# Altium footprint library YS_PCBLIB.PcbLib: 133 footprints (part 4 of 9)
Each footprint in its own frame and in the unit in brackets; x right, y up, seen from the top. Pads: shape width x height; smd on the part's side, far side on the other; paste and mask are expansions set on the pad; w line width, h text height; cw(c..) or ccw(c..) is an arc to the next point about the centre after c.
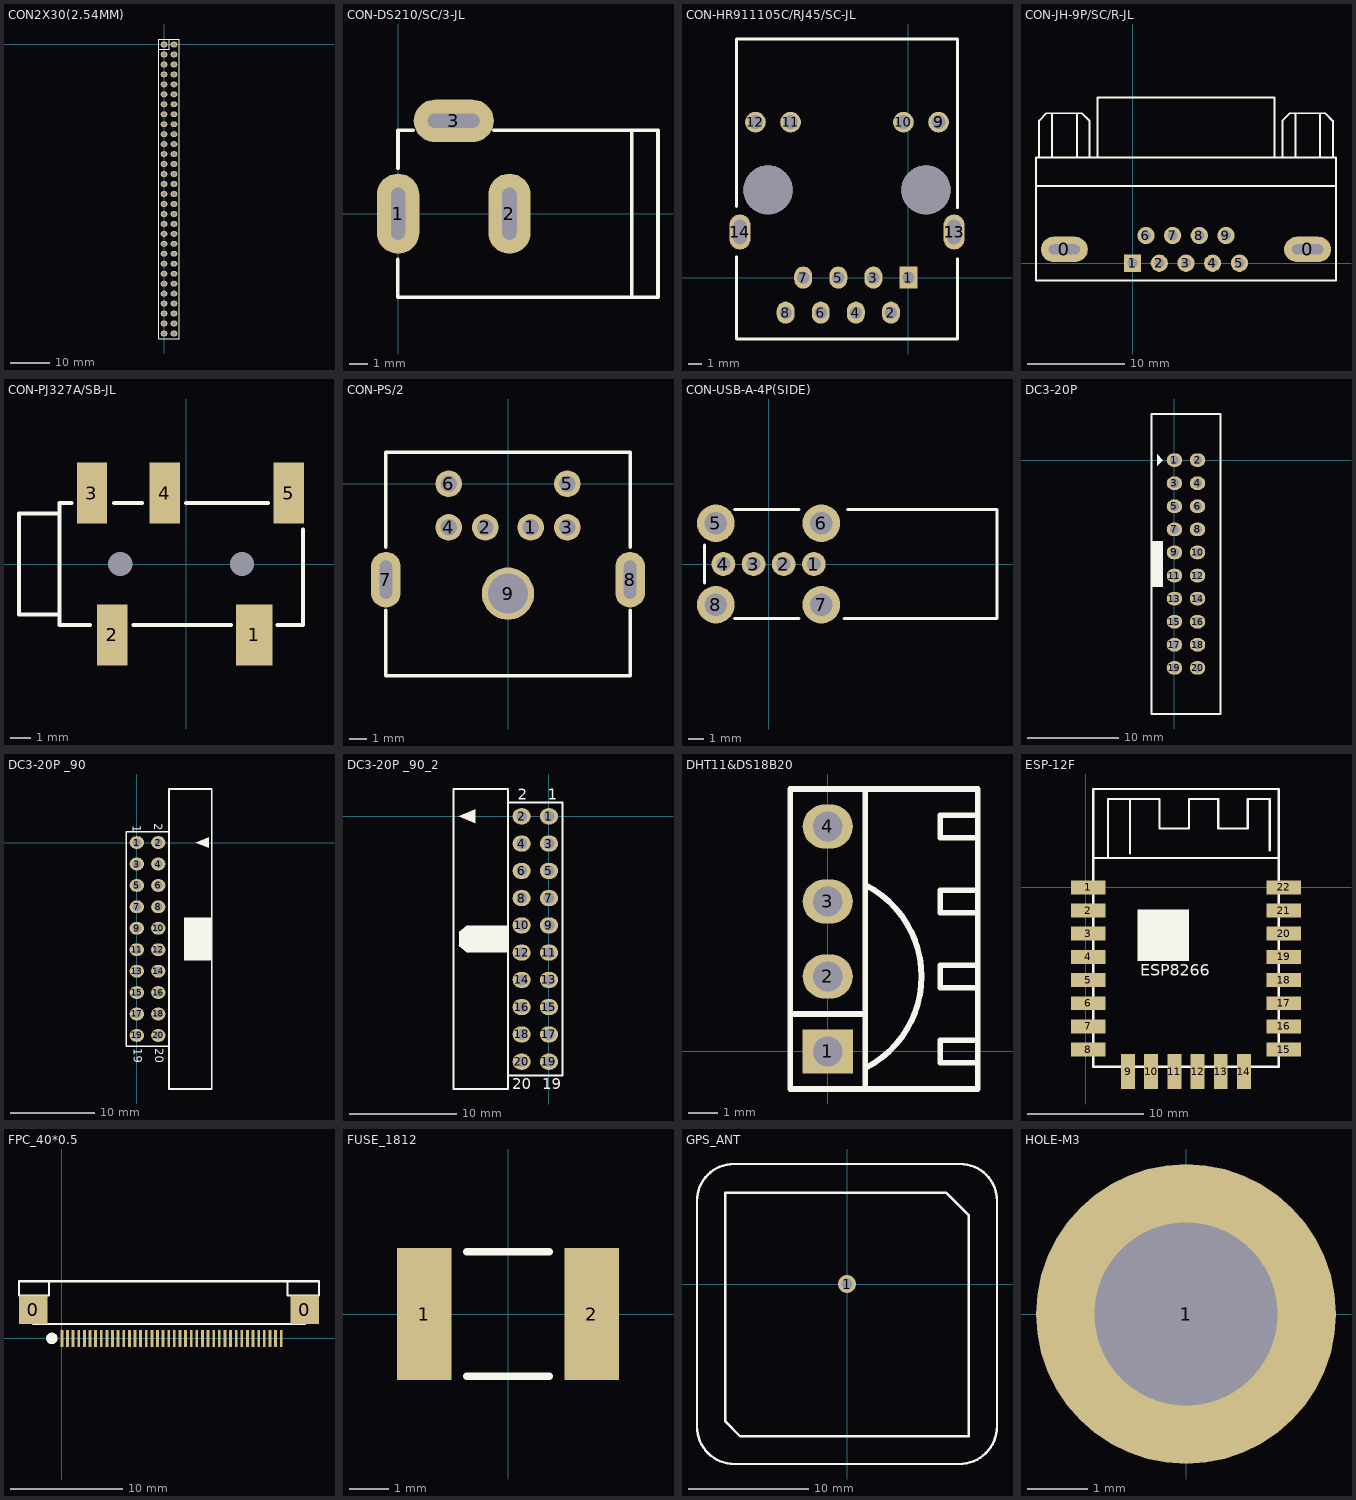
[diagram p3: the footprints below, top view; thin cyan lines are the x and y axes]

## CON2X30(2.54MM) [mm]
pads (60):
  oval 1.7x1.5 hole 1: 1(0,0) 2(2.54,0) 3(0,-2.54) 4(2.54,-2.54) 5(0,-5.08) 6(2.54,-5.08) 7(0,-7.62) 8(2.54,-7.62) 9(0,-10.16) 10(2.54,-10.16) 11(0,-12.7) 12(2.54,-12.7) 13(0,-15.24) 14(2.54,-15.24) 15(0,-17.78) 16(2.54,-17.78) 17(0,-20.32) 18(2.54,-20.32) 19(0,-22.86) 20(2.54,-22.86) 21(0,-25.4) 22(2.54,-25.4) 23(0,-27.94) 24(2.54,-27.94) 25(0,-30.48) 26(2.54,-30.48) 27(0,-33.02) 28(2.54,-33.02) 29(0,-35.56) 30(2.54,-35.56) 31(0,-38.1) 32(2.54,-38.1) 33(0,-40.64) 34(2.54,-40.64) 35(0,-43.18) 36(2.54,-43.18) 37(0,-45.72) 38(2.54,-45.72) 39(0,-48.26) 40(2.54,-48.26) 41(0,-50.8) 42(2.54,-50.8) 43(0,-53.34) 44(2.54,-53.34) 45(0,-55.88) 46(2.54,-55.88) 47(0,-58.42) 48(2.54,-58.42) 49(0,-60.96) 50(2.54,-60.96) 51(0,-63.5) 52(2.54,-63.5) 53(0,-66.04) 54(2.54,-66.04) 55(0,-68.58) 56(2.54,-68.58) 57(0,-71.12) 58(2.54,-71.12) 59(0,-73.66) 60(2.54,-73.66)
Top Overlay:
  lines w0.2: -1.397,-1.27 1.27,-1.27 1.27,1.397 ; -1.397,-75.057 -1.397,1.397 3.937,1.397 3.937,-75.057 -1.397,-75.057

## CON-DS210/SC/3-JL [mil]
pads (3):
  oval 90x170 hole 30 slot 110 at 90 deg: 1(0,0) 2(236.22,0)
  oval 170x90 hole 30 slot 110 at 0 deg: 3(118.11,196.85)
Top Overlay:
  lines w7.87: -0.89,-96.46 -0.89,-177.16 551.18,-177.16 551.18,177.16 202.76,177.16 ; -0.04,96.46 -0.04,176.78 31.5,176.78 ; 495.63,-171.73 495.63,176.27

## CON-HR911105C/RJ45/SC-JL [mm]
pads (16):
  rect 1.3x1.6 hole 0.9: 1(0,0)
  oval 1.3x1.6 hole 0.9: 2(-1.27,-2.54) 3(-2.54,0) 4(-3.81,-2.54) 5(-5.08,0) 6(-6.35,-2.54) 7(-7.62,0) 8(-8.89,-2.54)
  round 1.5 hole 1.02: 9(2.175,11.25) 10(-0.365,11.25) 11(-8.535,11.25) 12(-11.075,11.25)
  oval 1.524x2.54 hole 1.016 slot 1.778 at 90 deg: 13(3.3,3.3) 14(-12.2,3.3)
  round 3.556 hole 3.556: ""(-10.165,6.35) ""(1.265,6.35)
Top Overlay:
  lines w0.2: -12.45,1.503 -12.45,-4.445 3.55,-4.445 3.55,1.372 ; -12.45,5.147 -12.45,17.27 3.55,17.27 3.55,5.053

## CON-JH-9P/SC/R-JL [mil]
pads (11):
  oval 190x102.36 hole 39.37 slot 125.98 at 0 deg: 0(-275.79,55.91) 0(708.07,55.91)
  rect 70x70 hole 40: 1(0,0)
  round 70 hole 40: 2(108.27,0) 3(216.14,0) 4(324.02,0) 5(432.28,0) 6(54.33,111.81) 7(162.2,111.81) 8(270.08,111.81) 9(377.95,111.81)
Top Overlay:
  lines w7.87: -390.35,312.84 822.8,312.84 ; -378.15,426.77 -378.15,576.85 ; -378.15,575 -378.15,576.85 ; -325,426.77 -325,605 ; -225,426.77 -225,606.3 ; -173.43,426.77 -173.43,575 -204.73,606.3 -348.7,606.3 -378.15,576.85 ; 605.71,426.77 605.71,576.85 ; 605.71,575 605.71,576.85 ; 658.86,426.77 658.86,605 ; 758.86,426.77 758.86,606.3 ; 810.43,426.77 810.43,575 779.13,606.3 635.16,606.3 605.71,576.85 ; 822.64,426.77 822.64,-70.08 -390.35,-70.08 -390.35,426.77 822.8,426.77 ; -142.13,426.77 574.41,426.77 574.41,670.08 -142.13,670.08 -142.13,426.77

## CON-PJ327A/SB-JL [mm]
pads (7):
  rect 1.8x3 smd: 1(3.35,-3.5)
  rect 1.5x3 smd: 2(-3.65,-3.5) 3(-4.65,3.5) 4(-1.05,3.5) 5(5.05,3.5)
  round 1.15 hole 1.2 unplated: ""(-3.25,0) ""(2.75,0)
Top Overlay:
  lines w0.2: -6.295,-2.5 -8.25,-2.5 -8.25,2.5 -6.25,2.5 ; -6.25,-3 -6.25,3 -5.67,3 ; -6.2,-3 -4.75,-3 ; -3.55,3 -2.18,3 ; -2.6,-3 2.2,-3 ; 0,3 4.04,3 ; 4.5,-3 5.75,-3 5.75,1.7

## CON-PS/2 [mil]
pads (9):
  round 60 hole 37: 1(51.18,-98.43) 2(-51.18,-98.43) 3(133.86,-98.43) 4(-133.86,-98.43) 5(133.86,0) 6(-133.86,0)
  oval 66.93x125.98 hole 27.56 slot 86.61 at 90 deg: 7(-275.59,-216.54) 8(275.59,-216.54)
  round 118 hole 90: 9(0,-248.03)
Top Overlay:
  lines w7.87: -275.59,-285.11 -275.59,-433.07 275.59,-433.07 275.59,-285.11 ; -275.59,-143.69 -275.59,70.87 275.59,70.87 275.59,-143.69

## CON-USB-A-4P(SIDE) [mm]
pads (8):
  round 1.575 hole 0.92: 1(3,0) 2(1,0) 3(-1,0) 4(-3,0)
  round 2.5 hole 1.5: 5(-3.5,2.7) 6(3.5,2.7) 7(3.5,-2.7) 8(-3.5,-2.7)
Top Overlay:
  lines w0.2: -4.25,-1.25 -4.25,1.25 ; -2.25,-3.6 2,-3.6 ; -2.25,3.6 2,3.6 ; 5,-3.6 15.15,-3.6 15.15,3.6 5.25,3.6

## DC3-20P [mm]
pads (20):
  oval 1.7x1.5 hole 1: 1(0,0) 2(2.54,0) 3(0,-2.54) 4(2.54,-2.54) 5(0,-5.08) 6(2.54,-5.08) 7(0,-7.62) 8(2.54,-7.62) 9(0,-10.16) 10(2.54,-10.16) 11(0,-12.7) 12(2.54,-12.7) 13(0,-15.24) 14(2.54,-15.24) 15(0,-17.78) 16(2.54,-17.78) 17(0,-20.32) 18(2.54,-20.32) 19(0,-22.86) 20(2.54,-22.86)
Top Overlay:
  rectangle: -2.54,-13.97 -1.27,-8.89
  region: -1.905,0.635 -1.27,0 -1.905,-0.635
  lines w0.2: -2.54,-27.94 -2.54,0 -2.54,2.54 -2.54,5.08 5.08,5.08 5.08,-27.94 -2.54,-27.94

## DC3-20P _90 [mm]
pads (20):
  oval 1.7x1.5 hole 1: 1(0,0) 2(2.54,0) 3(0,-2.54) 4(2.54,-2.54) 5(0,-5.08) 6(2.54,-5.08) 7(0,-7.62) 8(2.54,-7.62) 9(0,-10.16) 10(2.54,-10.16) 11(0,-12.7) 12(2.54,-12.7) 13(0,-15.24) 14(2.54,-15.24) 15(0,-17.78) 16(2.54,-17.78) 17(0,-20.32) 18(2.54,-20.32) 19(0,-22.86) 20(2.54,-22.86)
Top Overlay:
  rectangle: 5.588,-13.97 8.89,-8.89
  region: 8.509,-0.635 8.509,0 6.985,0
  region: 8.509,0.635 8.509,0 6.985,0
  lines w0.203: 3.81,-24.13 3.81,-29.21 8.89,-29.21 8.89,6.35 3.81,6.35 3.81,1.27 ; 3.81,-24.13 3.81,1.27 ; 3.81,-24.13 -1.27,-24.13 -1.27,1.27 3.81,1.27
  text "1" at -0.508,2.032 h1.02
  text "2" at 2.032,2.286 h1.02
  text "19" at -0.381,-24.384 h1.02
  text "20" at 2.159,-24.384 h1.02

## DC3-20P _90_2 [mm]
pads (20):
  oval 1.7x1.5 hole 1: 1(0,0) 2(-2.54,0) 3(0,-2.54) 4(-2.54,-2.54) 5(0,-5.08) 6(-2.54,-5.08) 7(0,-7.62) 8(-2.54,-7.62) 9(0,-10.16) 10(-2.54,-10.16) 11(0,-12.7) 12(-2.54,-12.7) 13(0,-15.24) 14(-2.54,-15.24) 15(0,-17.78) 16(-2.54,-17.78) 17(0,-20.32) 18(-2.54,-20.32) 19(0,-22.86) 20(-2.54,-22.86)
Top Overlay:
  region: -7.62,-10.795 -8.382,-10.795 -8.382,-12.065 -7.62,-12.065
  region: -3.81,-10.16 -7.62,-10.16 -7.62,-12.7 -3.81,-12.7
  region: -7.62,-12.7 -7.62,-12.065 -8.382,-12.065
  region: -7.62,-10.16 -7.62,-10.795 -8.382,-10.795
  region: -6.858,0.635 -6.858,0 -8.382,0
  region: -6.858,-0.635 -6.858,0 -8.382,0
  lines w0.203: -3.81,-24.13 1.27,-24.13 1.27,1.27 -3.81,1.27 ; -3.81,-24.13 -3.81,1.27 ; -3.81,-24.13 -3.81,-25.4 -8.89,-25.4 -8.89,2.54 -3.81,2.54 -3.81,1.27
  text "20" at -3.429,-25.4 h1.02
  text "19" at -0.635,-25.4 h1.02
  text "2" at -2.921,1.524 h1.02
  text "1" at -0.127,1.524 h1.02

## DHT11&DS18B20 [mm]
pads (4):
  rect 1.7x1.5 hole 1: 1(0,0)
  oval 1.7x1.5 hole 1: 2(0,2.54) 3(0,5.08) 4(0,7.62)
Top Overlay:
  lines w0.2: -1.27,1.27 1.27,1.27 ; 1.301,-0.545 ccw(c-0.302,2.54) 1.301,5.625 ; 5.08,-0.381 3.81,-0.381 3.81,0.381 5.08,0.381 ; 5.08,2.159 3.81,2.159 3.81,2.921 5.08,2.921 ; 5.08,4.699 3.81,4.699 3.81,5.461 5.08,5.461 ; 5.08,7.239 3.81,7.239 3.81,8.001 5.08,8.001 ; 1.27,-1.27 -1.27,-1.27 -1.27,8.89 1.27,8.89 ; 1.27,-1.27 1.27,8.89 ; 1.27,-1.27 5.08,-1.27 5.08,8.89 1.27,8.89

## ESP-12F [mm]
pads (22):
  rect 3x1.2 smd: 1(0.203,0) 2(0.203,-2) 3(0.203,-4) 4(0.203,-6) 5(0.203,-8) 6(0.203,-10) 7(0.203,-12) 8(0.203,-14) 15(17.069,-14) 16(17.069,-12) 17(17.069,-10) 18(17.069,-8) 19(17.069,-6) 20(17.069,-4) 21(17.069,-2) 22(17.069,0)
  rect 1.2x3 smd: 9(3.632,-15.9) 10(5.632,-15.9) 11(7.632,-15.9) 12(9.632,-15.9) 13(11.632,-15.9) 14(13.632,-15.9)
Top Overlay:
  rectangle: 4.445,-6.35 8.89,-1.905
  lines w0.2: 0.635,2.54 16.637,2.54 ; 1.905,2.54 1.905,7.62 6.35,7.62 6.35,5.08 8.89,5.08 8.89,7.62 11.43,7.62 11.43,5.08 13.97,5.08 13.97,7.62 15.875,7.62 15.875,3.175 ; 3.81,2.921 3.81,7.62 ; 0.635,-15.494 16.637,-15.494 16.637,8.486 0.635,8.486 0.635,-15.494
  text "ESP8266" at 4.699,-7.62 h1

## FPC_40*0.5 [mm]
pads (42):
  rect 2.54x2.54 smd: 0(-2.54,2.54) 0(21.59,2.54)
  rect 0.25x1.5 smd: 1(0,0) 2(0.5,0) 3(1,0) 4(1.5,0) 5(2,0) 6(2.5,0) 7(3,0) 8(3.5,0) 9(4,0) 10(4.5,0) 11(5,0) 12(5.5,0) 13(6,0) 14(6.5,0) 15(7,0) 16(7.5,0) 17(8,0) 18(8.5,0) 19(9,0) 20(9.5,0) 21(10,0) 22(10.5,0) 23(11,0) 24(11.5,0) 25(12,0) 26(12.5,0) 27(13,0) 28(13.5,0) 29(14,0) 30(14.5,0) 31(15,0) 32(15.5,0) 33(16,0) 34(16.5,0) 35(17,0) 36(17.5,0) 37(18,0) 38(18.5,0) 39(19,0) 40(19.5,0)
Top Overlay:
  circle w0.508: c-0.889,0 r0.254
  lines w0.2: -2.159,3.81 -3.81,3.81 -3.81,5.08 -1.143,5.08 ; 21.336,3.81 22.86,3.81 22.86,5.08 20.066,5.08 ; -1.143,5.08 20.066,5.08 ; -1.143,5.08 -1.143,3.81 -2.54,3.81 -2.54,1.27 -0.635,1.27 21.59,1.27 21.59,3.81 20.066,3.81 20.066,5.08

## FUSE_1812 [mm]
height 0.34
pads (2):
  rect 1.4x3.4 smd: 1(-2.15,0) 2(2.15,0)
Top Overlay:
  lines w0.2: -1.05,-1.6 1.05,-1.6 ; -1.05,1.6 1.05,1.6

## GPS_ANT [mm]
pads (1):
  round 1.5 hole 0.9: 1(0,0)
Top Overlay:
  lines w0.2: -10.16,-11.43 -8.89,-12.7 10.16,-12.7 10.16,5.715 8.255,7.62 -10.16,7.62 -10.16,-11.43
  lines w0.203: -12.5,-11.891 ccw(c-9.391,-11.891) -9.391,-15 9.357,-15 ccw(c9.357,-11.857) 12.5,-11.857 12.5,6.934 ccw(c9.434,6.934) 9.434,10 -9.43,10 ccw(c-9.43,6.93) -12.5,6.93 -12.5,-11.891

## HOLE-M3 [mm]
pads (1):
  round 5 hole 3.05: 1(0,0)